# Altium footprint library CMRat_GEN2.8.PcbLib: 50 footprints (part 3 of 4)
Each footprint in its own frame and in the unit in brackets; x right, y up, seen from the top. Pads: shape width x height; smd on the part's side, far side on the other; paste and mask are expansions set on the pad; w line width, h text height; cw(c..) or ccw(c..) is an arc to the next point about the centre after c.
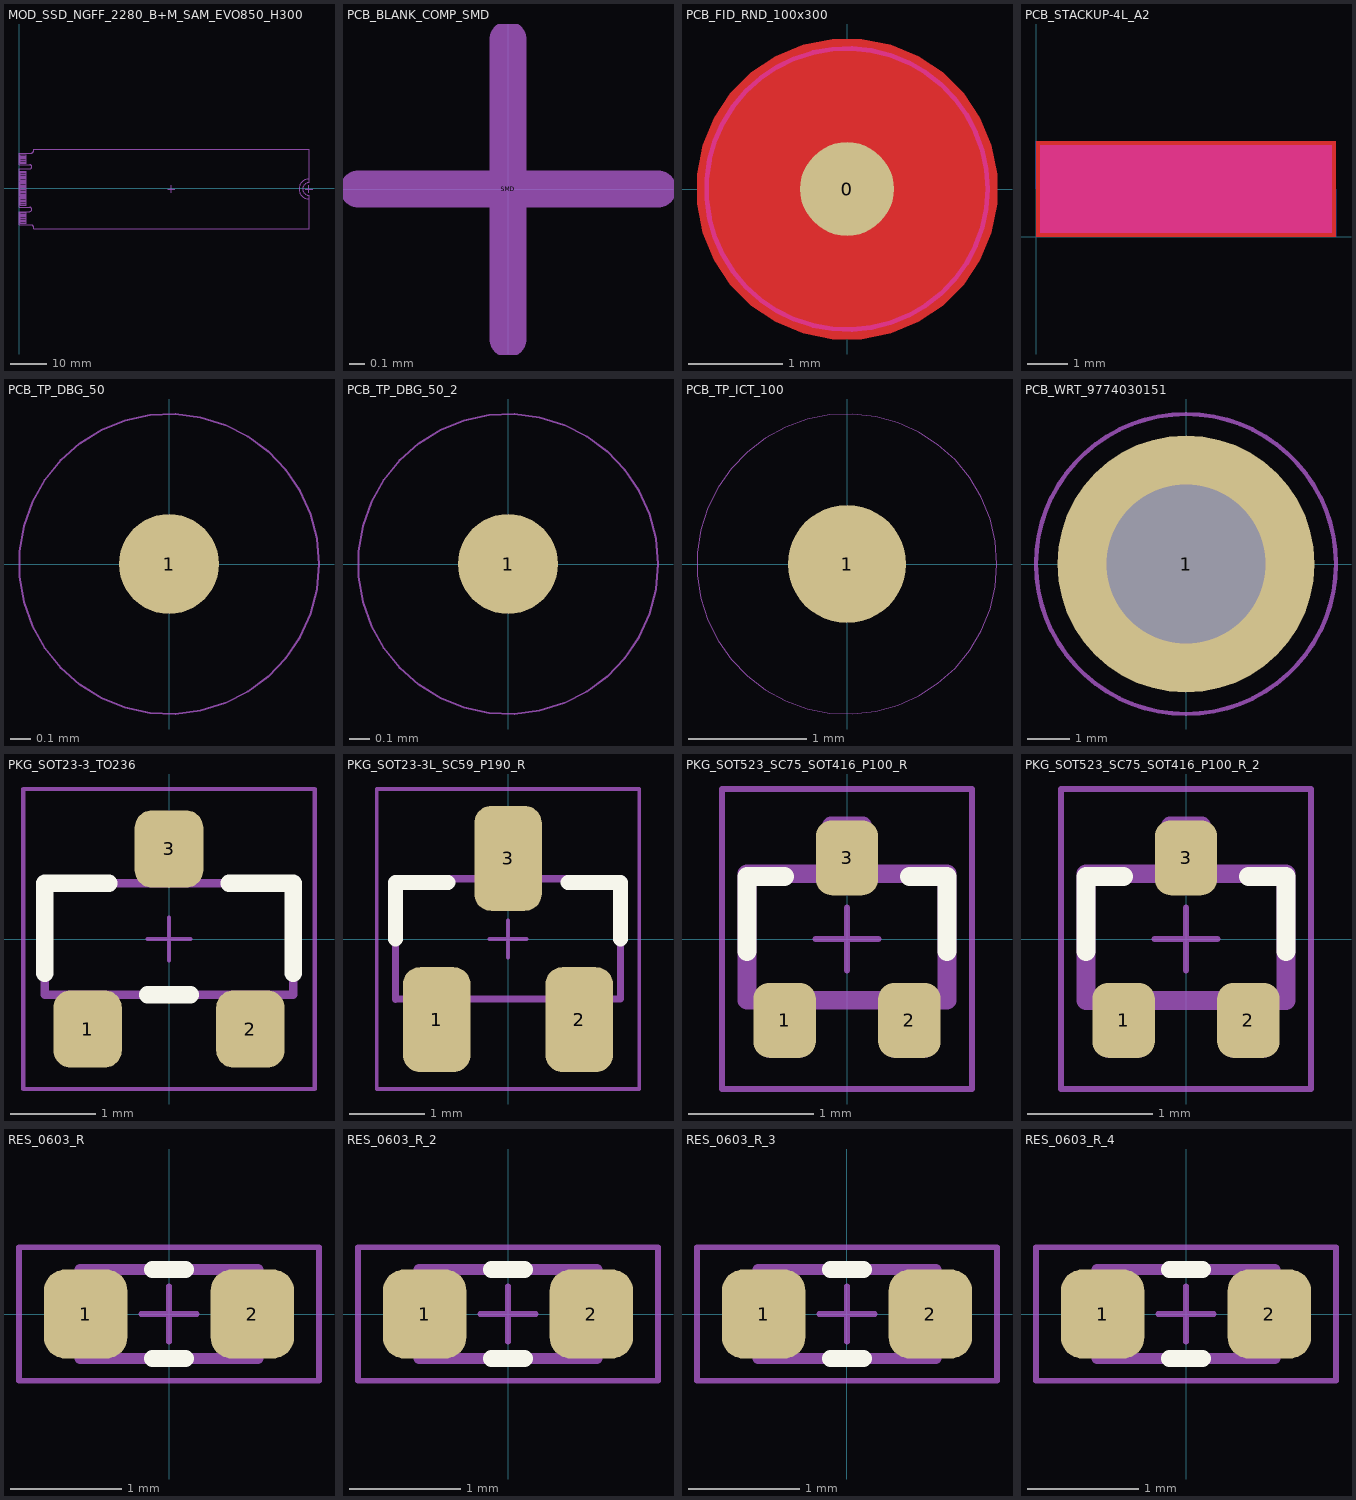
[diagram p2: the footprints below, top view; thin cyan lines are the x and y axes]

## MOD_SSD_NGFF_2280_B+M_SAM_EVO850_H300 [mm]
Mechanical 17:
  drawing of 156 lines, arcs and shapes, not listed
3D body "Samsung 850 EVO M.2 250GB SSD.STEP": height 4.5, standoff 2.93, extent 0,-11.375 80.15,10.775

## PCB_BLANK_COMP_SMD [mm]
pads (1):
  round 0.1 on Mech19: SMD(0,0)
Mechanical 19:
  lines w0.25: -1,0 1,0 ; 0,-1 0,1
  text ".Designator" at 2.1,1.7 h2

## PCB_FID_RND_100x300 [mm]
height 20
pads (1):
  round 1 smd paste-10 mask+1: 0(0,0)
Top Layer:
  pour cut-out: -1.6,0 -1.6,-0.158 -1.539,-0.467 -1.418,-0.758 -1.243,-1.02 -1.02,-1.243 -0.758,-1.418 -0.467,-1.539 -0.158,-1.6 0,-1.6 0.158,-1.6 0.467,-1.539 0.758,-1.418 1.02,-1.243 1.243,-1.02 1.418,-0.758 1.539,-0.467 1.6,-0.158 1.6,0 1.6,0.158 1.539,0.467 1.418,0.758 1.243,1.02 1.02,1.243 0.758,1.418 0.467,1.539 0.158,1.6 0,1.6 -0.158,1.6 -0.467,1.539 -0.758,1.418 -1.02,1.243 -1.243,1.02 -1.418,0.758 -1.539,0.467 -1.6,0.158
Top Layer keep-out:
  circle w0.05: c0,0 r1.5

## PCB_STACKUP-4L_A2 [mm]
Top Layer:
  pour cut-out: 0,2.4 7.5,2.4 7.5,0 0,0
  lines w0.2: 0.25,0.25 1.85,0.25 1.85,2.15 0.25,2.15 0.25,0.25
  text "1" at 0.9,0.7 h1
Mid-Layer 1:
  lines w0.2: 2.05,0.25 3.65,0.25 3.65,2.15 2.05,2.15 2.05,0.25
  text "2" at 2.5,0.7 h1
Mid-Layer 2:
  lines w0.2: 3.85,0.25 5.45,0.25 5.45,2.15 3.85,2.15 3.85,0.25
  text "3" at 4.3,0.7 h1
Bottom Layer:
  pour cut-out: 7.5,2.4 0,2.4 0,0 7.5,0
  lines w0.2: 5.65,0.25 7.25,0.25 7.25,2.15 5.65,2.15 5.65,0.25
  text "4" at 6.15,0.7 h1
Top Solder:
  rectangle: 1.95,0.1 7.4,2.3
Bottom Solder:
  rectangle: 0.1,0.1 5.55,2.3
Keep-Out Layer:
  rectangle: 0.1,0.1 7.4,2.3

## PCB_TP_DBG_50 [mm] "Testpoint"
height 7.12
pads (1):
  round 0.5 smd paste-10: 1(0,0)
Mechanical 27:
  circle w0.01: c0,0 r0.75
  text ".Designator" at 1.05,1.2 h0.5

## PCB_TP_DBG_50_2 [mm]
pads (1):
  round 0.5 smd paste-10: 1(0,0)
Mechanical 27:
  circle w0.01: c0,0 r0.75
  text ".Designator" at 1.029,1 h0.5

## PCB_TP_ICT_100 [mm] "testpoint"
height 13.25
pads (1):
  round 1 smd paste-10: 1(0,0)
Mechanical 27:
  circle w0.01: c0,0 r1.27
  text ".Designator" at -0.6,-0.2 h0.5

## PCB_WRT_9774030151 [mm] "SMT Steel Spacer with internal Thread M2.5, height 3mm"
height 3
pads (1):
  round 6 / inner round 0 / far side round 0 hole 3.7 unplated: 1(0,0)
Top Paste:
  region: 0.325,2.902 0.57,2.874 1.044,2.738 1.488,2.524 1.89,2.239 2.239,1.89 2.524,1.488 2.738,1.044 2.874,0.57 2.902,0.325 1.872,0.325 1.842,0.467 1.749,0.743 1.615,1.002 1.443,1.237 1.237,1.442 1.002,1.614 0.744,1.748 0.468,1.842 0.325,1.872
  region: 2.902,-0.325 2.874,-0.57 2.738,-1.044 2.524,-1.488 2.239,-1.89 1.89,-2.239 1.488,-2.524 1.044,-2.738 0.57,-2.874 0.325,-2.902 0.325,-1.872 0.467,-1.842 0.743,-1.749 1.002,-1.615 1.237,-1.443 1.442,-1.237 1.614,-1.002 1.748,-0.744 1.842,-0.468 1.872,-0.325
  region: -0.325,-2.902 -0.57,-2.874 -1.044,-2.738 -1.488,-2.524 -1.89,-2.239 -2.239,-1.89 -2.524,-1.488 -2.738,-1.044 -2.874,-0.57 -2.902,-0.325 -1.872,-0.325 -1.842,-0.467 -1.749,-0.743 -1.615,-1.002 -1.443,-1.237 -1.237,-1.442 -1.002,-1.614 -0.744,-1.748 -0.468,-1.842 -0.325,-1.872
  region: -2.902,0.325 -2.874,0.57 -2.738,1.044 -2.524,1.488 -2.239,1.89 -1.89,2.239 -1.488,2.524 -1.044,2.738 -0.57,2.874 -0.325,2.902 -0.325,1.872 -0.467,1.842 -0.743,1.749 -1.002,1.615 -1.237,1.443 -1.442,1.237 -1.614,1.002 -1.748,0.744 -1.842,0.468 -1.872,0.325
Mechanical 19:
  circle w0.1: c0,0 r2.55
  text ".Designator" at 3.173,2.862 h1.5
Mechanical 23:
  circle w0.1: c0,0 r3.5
  lines w0.1: -0.5,0 0.5,0 ; 0,-0.5 0,0.5
3D body "9774030151.stp": height 3, standoff -1.4, extent -2.55,-2.547 2.55,2.547

## PKG_SOT23-3_TO236 [mm]
height 13.25
pads (3):
  rrect50% 0.8x0.9 smd: 1(-0.95,-1.05) 2(0.95,-1.05) 3(0,1.05)
Top Overlay:
  lines w0.2: -1.45,-0.4 -1.45,0.65 -0.7,0.65 ; -0.25,-0.65 0,-0.65 0.25,-0.65 ; 0.7,0.65 1.45,0.65 1.45,-0.4
Mechanical 19:
  lines w0.1: -1.2,-0.65 -1.2,-1.221 -0.7,-1.221 -0.7,-0.65 ; -0.25,0.65 -0.25,1.221 0.25,1.221 0.25,0.65 ; 0.7,-0.65 0.7,-1.221 1.2,-1.221 1.2,-0.65 ; -1.45,-0.65 -1.45,0.65 1.45,0.65 1.45,-0.65 -1.45,-0.65
  text ".Designator" at -1.15,-0.35 h1.2
Mechanical 23:
  lines w0.05: -0.25,0 0.25,0 ; 0,-0.25 0,0.25 ; -1.7,-1.75 -1.7,1.75 1.7,1.75 1.7,-1.75 -1.7,-1.75
3D body "SOT-23_ONSEMI.step": height 1, standoff 0, extent -1.444,-1.221 1.444,1.221

## PKG_SOT23-3L_SC59_P190_R [mm]
height 1.1
pads (3):
  rrect50% 0.9x1.4 smd: 1(-0.95,-1.075) 2(0.95,-1.075) 3(0,1.075)
Top Overlay:
  lines w0.2: -1.497,0 -1.497,0.75 -0.8,0.75 ; 0.8,0.75 1.497,0.75 1.497,0
Mechanical 19:
  lines w0.1: -1.2,-0.8 -1.2,-1.5 -0.7,-1.5 -0.7,-0.8 ; -0.25,0.8 -0.25,1.5 0.25,1.5 0.25,0.8 ; 0.7,-0.8 0.7,-1.5 1.2,-1.5 1.2,-0.8 ; -1.5,-0.8 1.5,-0.8 1.5,0.8 -1.5,0.8 -1.5,-0.8
  text ".Designator" at 1.85,0.95 h1
Mechanical 23:
  lines w0.05: -0.25,0 0.25,0 ; 0,-0.25 0,0.25 ; -1.75,-2 1.75,-2 1.75,2 -1.75,2 -1.75,-2
3D body "SC59.STEP": height 1.25, standoff -0.15, extent -1.5,-1.4 1.5,1.399

## PKG_SOT523_SC75_SOT416_P100_R [mm]
height 7
pads (3):
  rrect50% 0.5x0.6 smd: 1(-0.5,-0.65) 2(0.5,-0.65) 3(0,0.65)
Top Overlay:
  lines w0.15: -0.8,-0.1 -0.8,0.5 -0.5,0.5 ; 0.5,0.5 0.8,0.5 0.8,-0.1
Mechanical 19:
  lines w0.15: -0.627,-0.491 -0.627,-0.872 -0.373,-0.872 -0.373,-0.491 ; -0.127,0.523 -0.127,0.904 0.127,0.904 0.127,0.523 ; 0.373,-0.491 0.373,-0.872 0.627,-0.872 0.627,-0.491 ; -0.8,-0.491 -0.8,0.523 0.8,0.523 0.8,-0.491 -0.8,-0.491
  text ".Designator" at -1.55,0.75 h0.8
Mechanical 23:
  lines w0.05: -0.25,0 0.25,0 ; 0,-0.25 0,0.25 ; -1,-1.2 1,-1.2 1,1.2 -1,1.2 -1,-1.2
3D body "User Library-SOT-416.step": height 0.79, standoff -0.01, extent -0.8,-0.785 0.8,0.815

## PKG_SOT523_SC75_SOT416_P100_R_2 [mm]
pads (3):
  rrect50% 0.5x0.6 smd: 1(-0.5,-0.65) 2(0.5,-0.65) 3(0,0.65)
Top Overlay:
  lines w0.15: -0.8,-0.1 -0.8,0.5 -0.5,0.5 ; 0.5,0.5 0.8,0.5 0.8,-0.1
Mechanical 19:
  lines w0.15: -0.627,-0.491 -0.627,-0.872 -0.373,-0.872 -0.373,-0.491 ; -0.127,0.523 -0.127,0.904 0.127,0.904 0.127,0.523 ; 0.373,-0.491 0.373,-0.872 0.627,-0.872 0.627,-0.491 ; -0.8,-0.491 0.8,-0.491 0.8,0.523 -0.8,0.523 -0.8,-0.491
  text ".Designator" at -0.25,-3.45 h1
Mechanical 23:
  lines w0.05: -0.25,0 0.25,0 ; 0,-0.25 0,0.25 ; -1,-1.2 -1,1.2 1,1.2 1,-1.2 -1,-1.2
3D body "User Library-SOT-416.step": height 0.79, standoff -0.01, extent -0.8,-0.785 0.8,0.815

## RES_0603_R [mm]
height 10.7
pads (2):
  rrect50% 0.75x0.8 smd: 1(-0.75,0) 2(0.75,0)
Top Overlay:
  lines w0.15: -0.15,-0.4 0.15,-0.4 ; -0.15,0.4 0.15,0.4
Mechanical 19:
  lines w0.1: -0.8,-0.4 0.8,-0.4 0.8,0.4 -0.8,0.4 -0.8,-0.4
  text ".Designator" at -0.95,-1.35 h1
Mechanical 23:
  lines w0.05: -0.25,0 0.25,0 ; 0,-0.25 0,0.25 ; -1.35,-0.6 1.35,-0.6 1.35,0.6 -1.35,0.6 -1.35,-0.6
3D body "RESC1608X_0603.step": height 0.3, standoff 0, extent -0.8,-0.4 0.8,0.4

## RES_0603_R_2 [mm]
pads (2):
  rrect50% 0.75x0.8 smd: 1(-0.75,0) 2(0.75,0)
Top Overlay:
  lines w0.15: -0.15,-0.4 0.15,-0.4 ; -0.15,0.4 0.15,0.4
Mechanical 19:
  lines w0.1: -0.8,-0.4 0.8,-0.4 0.8,0.4 -0.8,0.4 -0.8,-0.4
  text ".Designator" at 1.05,1.3 h1
Mechanical 23:
  lines w0.05: -0.25,0 0.25,0 ; 0,-0.25 0,0.25 ; -1.35,-0.6 1.35,-0.6 1.35,0.6 -1.35,0.6 -1.35,-0.6
3D body "RESC1608X_0603.step": height 0.3, standoff 0, extent -0.8,-0.4 0.8,0.4

## RES_0603_R_3 [mm]
pads (2):
  rrect50% 0.75x0.8 smd: 1(-0.75,0) 2(0.75,0)
Top Overlay:
  lines w0.15: -0.15,-0.4 0.15,-0.4 ; -0.15,0.4 0.15,0.4
Mechanical 19:
  lines w0.1: -0.8,-0.4 -0.8,0.4 0.8,0.4 0.8,-0.4 -0.8,-0.4
  text ".Designator" at 0.9,-0.7 h1
Mechanical 23:
  lines w0.05: -0.25,0 0.25,0 ; 0,-0.25 0,0.25 ; -1.35,-0.6 -1.35,0.6 1.35,0.6 1.35,-0.6 -1.35,-0.6
3D body "RESC1608X_0603.step": height 0.3, standoff 0, extent -0.8,-0.4 0.8,0.4

## RES_0603_R_4 [mm]
pads (2):
  rrect50% 0.75x0.8 smd: 1(-0.75,0) 2(0.75,0)
Top Overlay:
  lines w0.15: -0.15,-0.4 0.15,-0.4 ; -0.15,0.4 0.15,0.4
Mechanical 19:
  lines w0.1: -0.8,-0.4 0.8,-0.4 0.8,0.4 -0.8,0.4 -0.8,-0.4
  text ".Designator" at -0.95,0.65 h1
Mechanical 23:
  lines w0.05: -0.25,0 0.25,0 ; 0,-0.25 0,0.25 ; -1.35,-0.6 1.35,-0.6 1.35,0.6 -1.35,0.6 -1.35,-0.6
3D body "RESC1608X_0603.step": height 0.3, standoff 0, extent -0.8,-0.4 0.8,0.4